# Altium footprint library THU.PcbLib: 477 footprints (part 27 of 30)
Each footprint in its own frame and in the unit in brackets; x right, y up, seen from the top. Pads: shape width x height; smd on the part's side, far side on the other; paste and mask are expansions set on the pad; w line width, h text height; cw(c..) or ccw(c..) is an arc to the next point about the centre after c.
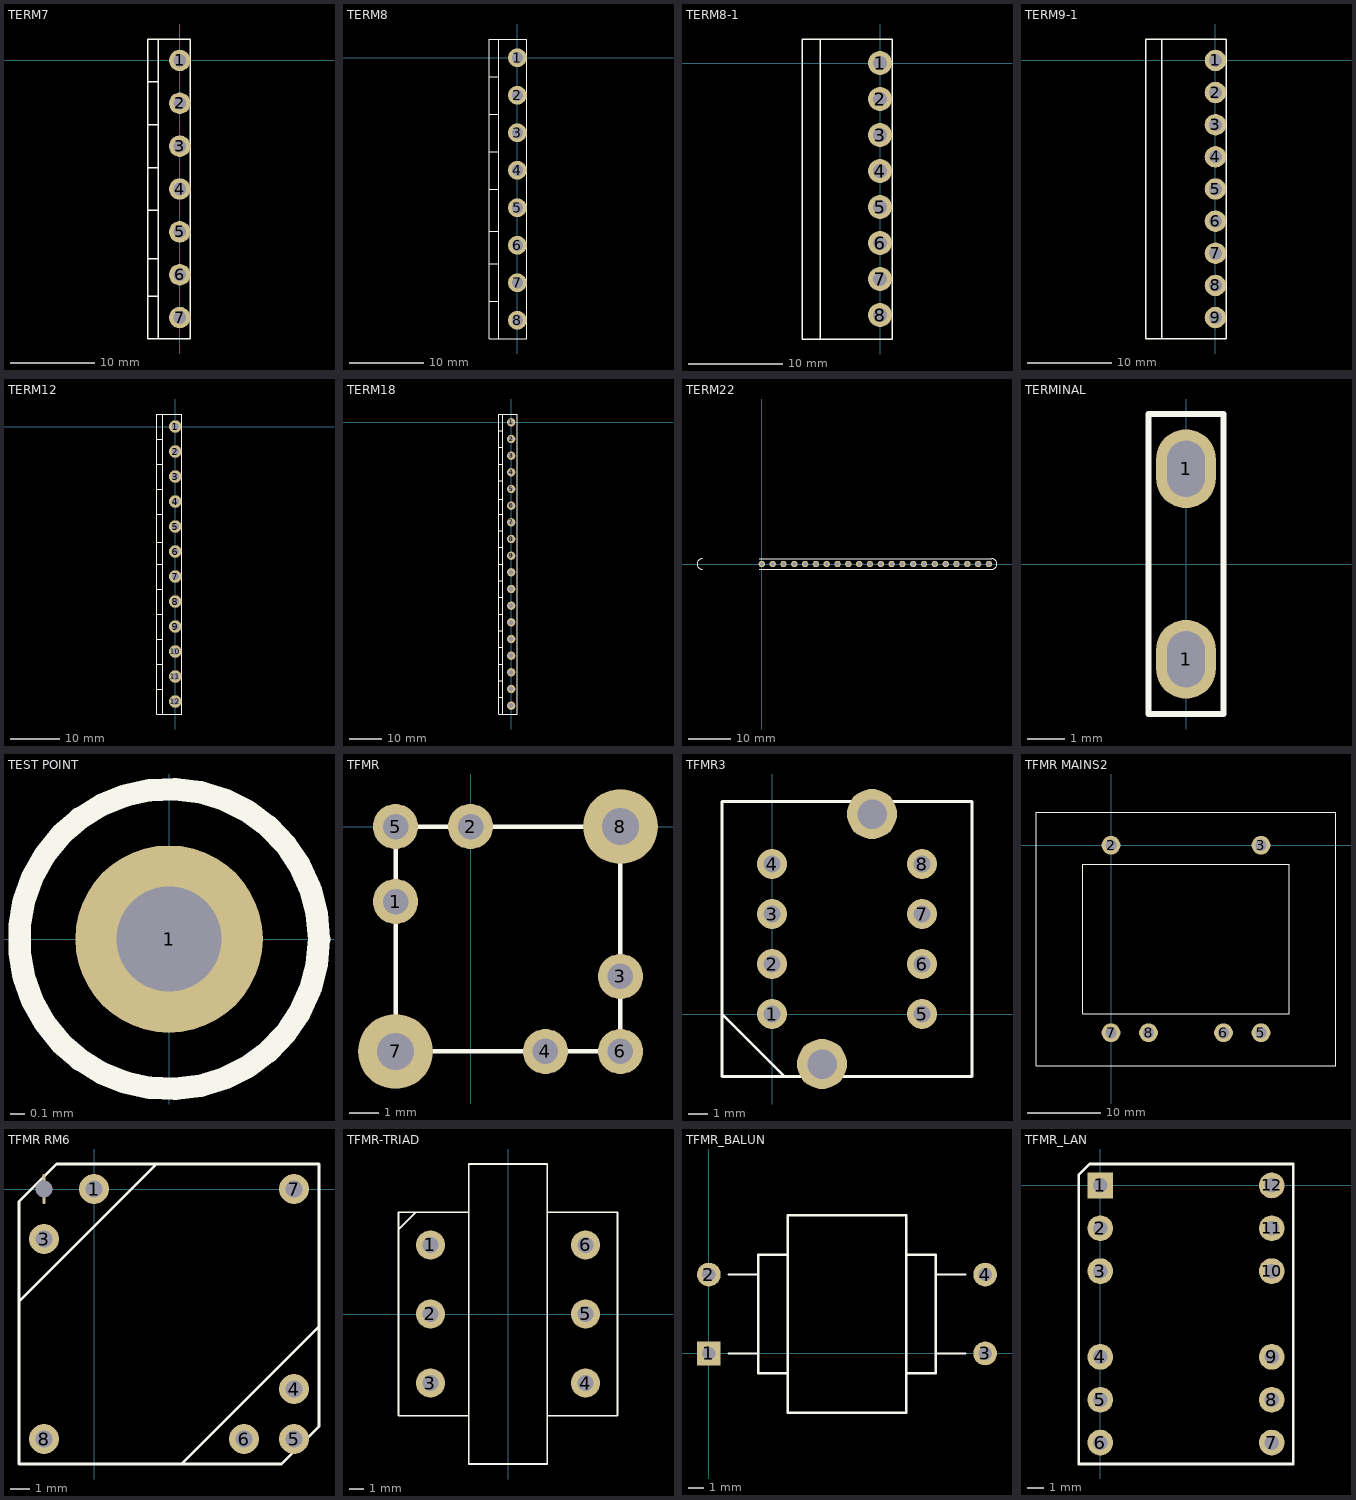
[diagram p26: the footprints below, top view; thin cyan lines are the x and y axes]

## TERM7 [mil]
pads (7):
  round 100 hole 59: 1(0,0) 2(0,-200) 3(0,-400) 4(0,-600) 5(0,-800) 6(0,-1000) 7(0,-1200)
TopOverlay:
  lines w6: -150,-1100 -100,-1100 ; -150,-925 -100,-925 ; -150,-500 -100,-500 ; -150,-300 -100,-300 ; -150,-100 -100,-100 ; -100,100 -100,-700 ; -150,-1300 -100,-1300 ; -150,-1300 50,-1300 50,100 -150,100 -150,-700 ; -150,-1300 -150,-700 ; -150,-1300 -100,-1300 ; -150,-700 -100,-700 ; -100,-1300 -100,-700

## TERM8 [mil]
pads (8):
  round 100 hole 59: 1(0,0) 2(0,-200) 3(0,-400) 4(0,-600) 5(0,-800) 6(0,-1000) 7(0,-1200) 8(0,-1400)
TopOverlay:
  lines w6: -150,-1300 -100,-1300 ; -150,-1100 -100,-1100 ; -150,-925 -100,-925 ; -150,-500 -100,-500 ; -150,-300 -100,-300 ; -150,-100 -100,-100 ; -100,100 -100,-700 ; -150,-1500 -100,-1500 -100,-700 ; -150,-1500 -150,-700 ; -150,-1500 50,-1500 50,100 -150,100 -150,-700 ; -150,-700 -100,-700

## TERM8-1 [mil]
pads (8):
  round 100 hole 59: 1(0,0) 2(0,-150) 3(0,-300) 4(0,-450) 5(0,-600) 6(0,-750) 7(0,-900) 8(0,-1050)
TopOverlay:
  lines w6: -325,-1150 -250,-1150 -250,100 -325,100 ; -325,-1150 -325,100 ; -325,-1150 50,-1150 50,100 -325,100

## TERM9-1 [mil]
pads (9):
  round 100 hole 59: 1(0,0) 2(0,-150) 3(0,-300) 4(0,-450) 5(0,-600) 6(0,-750) 7(0,-900) 8(0,-1050) 9(0,-1200)
TopOverlay:
  lines w6: -325,-1300 -250,-1300 -250,100 -325,100 ; -325,-1300 50,-1300 50,100 -325,100 ; -325,-1300 -325,100

## TERM12 [mil]
pads (12):
  round 100 hole 59: 1(0,0) 2(0,-200) 3(0,-400) 4(0,-600) 5(0,-800) 6(0,-1000) 7(0,-1200) 8(0,-1400) 9(0,-1600) 10(0,-1800) 11(0,-2000) 12(0,-2200)
TopOverlay:
  lines w6: -150,-2100 -100,-2100 ; -150,-1900 -100,-1900 ; -150,-1700 -100,-1700 ; -150,-1300 -100,-1300 ; -150,-1100 -100,-1100 ; -150,-925 -100,-925 ; -150,-500 -100,-500 ; -150,-300 -100,-300 ; -150,-100 -100,-100 ; -100,100 -100,-700 ; -150,-2300 50,-2300 50,100 -150,100 -150,-700 ; -150,-2300 -100,-2300 ; -150,-2300 -100,-2300 ; -150,-2300 -150,-1500 ; -150,-2300 -100,-2300 ; -150,-1500 -150,-700 ; -150,-1500 -100,-1500 ; -150,-700 -100,-700 ; -100,-2300 -100,-1500 ; -100,-1500 -100,-700

## TERM18 [mil]
pads (18):
  round 100 hole 59: 1(0,0) 2(0,-200) 3(0,-400) 4(0,-600) 5(0,-800) 6(0,-1000) 7(0,-1200) 8(0,-1400) 9(0,-1600) 10(0,-1800) 11(0,-2000) 12(0,-2200) 13(0,-2400) 14(0,-2600) 15(0,-3000) 16(0,-2800) 17(0,-3400) 18(0,-3200)
TopOverlay:
  lines w6: -150,-3300 -100,-3300 ; -150,-3100 -100,-3100 ; -150,-2900 -100,-2900 ; -150,-2500 -100,-2500 ; -150,-2300 -100,-2300 ; -150,-2100 -100,-2100 ; -150,-1700 -100,-1700 ; -150,-1300 -100,-1300 ; -150,-1100 -100,-1100 ; -150,-925 -100,-925 ; -150,-500 -100,-500 ; -150,-300 -100,-300 ; -150,-100 -100,-100 ; -100,100 -100,-700 ; -150,-3500 75,-3500 ; -150,-3500 -150,-1900 ; -150,-3500 -100,-3500 ; -150,-3500 -100,-3500 ; -150,-3500 75,-3500 ; -150,-3500 -100,-3500 ; -150,-1900 -150,-1500 ; -150,-1900 -100,-1900 ; -150,-1900 -100,-1900 ; -150,-1500 -150,-700 ; -150,-1500 -100,-1500 ; -150,-700 -150,100 75,100 75,-3500 ; -150,-700 -100,-700 ; -100,-3500 -100,-1900 ; -100,-1900 -100,-1500 ; -100,-1500 -100,-700 ; -150,-2700 -100,-2700 -150,-2700

## TERM22 [mil]
pads (22):
  round 60 hole 34: 1(0,0) 2(100,0) 3(200,0) 4(300,0) 5(400,0) 6(500,0) 7(600,0) 8(700,0) 9(800,0) 10(900,0) 11(1000,0) 12(1100,0) 13(1200,0) 14(1300,0) 15(1400,0) 16(1500,0) 17(1600,0) 18(1700,0) 19(1800,0) 20(1900,0) 21(2000,0) 22(2100,0)
TopOverlay:
  lines w6: -550,-50 cw(c-550,0) -550,50 ; -25,-50 925,-50 ; -25,50 925,50 ; 975,-50 925,-50 ; 975,50 925,50 ; 1925,-50 2125,-50 ; 1925,50 2125,50 ; 925,-50 2125,-50 ; 925,50 2125,50 ; 2125,-50 ccw(c2125,0) 2125,50

## TERMINAL [mm] "TAB, STRAIGHT, 6.3X0.8MM"
height 10
pads (2):
  oval 1.6x2.1 hole 1 slot 1.5 at 90 deg: 1(0,-2.54) 1(0,2.54)
TopOverlay:
  lines w0.152: -1,-4 0,-4 1,-4 1,0 1,4 0,4 -1,4 -1,0 -1,-4

## TEST POINT [mil]
pads (1):
  round 50 hole 28: 1(0,0)
TopOverlay:
  circle w6: c0,0 r40

## TFMR [mil]
pads (8):
  round 60 hole 34: 1(-100,-100) 2(0,0) 3(200,-200) 4(100,-300) 5(-100,0) 6(200,-300)
  round 100 hole 49: 7(-100,-300) 8(200,0)
TopOverlay:
  lines w6: -100,-300 200,-300 200,0 -100,0 -100,-300

## TFMR3 [mil]
pads (10):
  round 60 hole 34: 1(0,0) 2(0,100) 3(0,200) 4(0,300) 5(300,0) 6(300,100) 7(300,200) 8(300,300)
  round 100 hole 59: ""(100,-100) ""(200,400)
TopOverlay:
  lines w6: -100,0 25,-125 ; -100,-125 -100,425 400,425 400,-125 -100,-125

## TFMR MAINS2 [mil]
pads (6):
  round 100 hole 59: 2(0,0) 3(800,0) 5(800,-1000) 6(600,-1000) 7(0,-1000) 8(200,-1000)
TopOverlay:
  lines w6: -400,-1175 1200,-1175 1200,175 1100,175 -400,175 -400,-1175 ; -150,-900 950,-900 950,-100 -150,-100 -150,-900

## TFMR RM6 [mil]
pads (8):
  round 60 hole 34: 1(0,0) 3(-100,-100) 4(400,-400) 5(400,-500) 6(300,-500) 7(400,0) 8(-100,-500)
  oval 6x60 hole 34: 2(-100,0)
TopOverlay:
  lines w6: -150,-225 125,50 ; 175,-550 450,-275 ; -150,-550 -150,-25 -75,50 450,50 450,-475 375,-550 -150,-550

## TFMR-TRIAD [mm] "TY-141P"
height 0.403
pads (6):
  round 2 hole 1.1: 1(-5.334,4.75) 2(-5.334,0) 3(-5.334,-4.75) 4(5.334,-4.75) 5(5.334,0) 6(5.334,4.75)
TopOverlay:
  lines w0.127: -7.508,5.842 -6.35,7 ; -2.7,-7 -2.7,7 ; -2.7,-7 -7.526,-7 -7.526,7 -2.7,7 ; -2.7,-7 -2.7,-10.319 2.7,-10.319 2.7,-7 ; -2.7,7 -2.7,10.319 2.7,10.319 2.7,7 ; 2.7,-7 2.7,7 ; 2.7,-7 7.526,-7 7.526,7 2.7,7

## TFMR_BALUN [mil]
pads (4):
  rect 60x60 hole 34: 1(0,0)
  round 60 hole 34: 2(0,200) 3(700,0) 4(700,200)
TopOverlay:
  lines w6: 50,0 125,0 ; 50,200 125,200 ; 200,-50 125,-50 125,250 200,250 ; 500,-50 575,-50 575,250 500,250 ; 575,0 650,0 ; 575,200 650,200 ; 200,-150 500,-150 500,350 200,350 200,-150

## TFMR_LAN [mil]
pads (12):
  rect 60x60 hole 34: 1(0,0)
  round 60 hole 34: 2(0,-100) 3(0,-200) 4(0,-400) 5(0,-500) 6(0,-600) 7(400,-600) 8(400,-500) 9(400,-400) 10(400,-200) 11(400,-100) 12(400,0)
TopOverlay:
  lines w6: -50,-650 450,-650 450,50 -25,50 -50,25 -50,-650